# Altium footprint library 3.22-杂项.PcbLib: 985 footprints (part 63 of 64)
Each footprint in its own frame and in the unit in brackets; x right, y up, seen from the top. Pads: shape width x height; smd on the part's side, far side on the other; paste and mask are expansions set on the pad; w line width, h text height; cw(c..) or ccw(c..) is an arc to the next point about the centre after c.
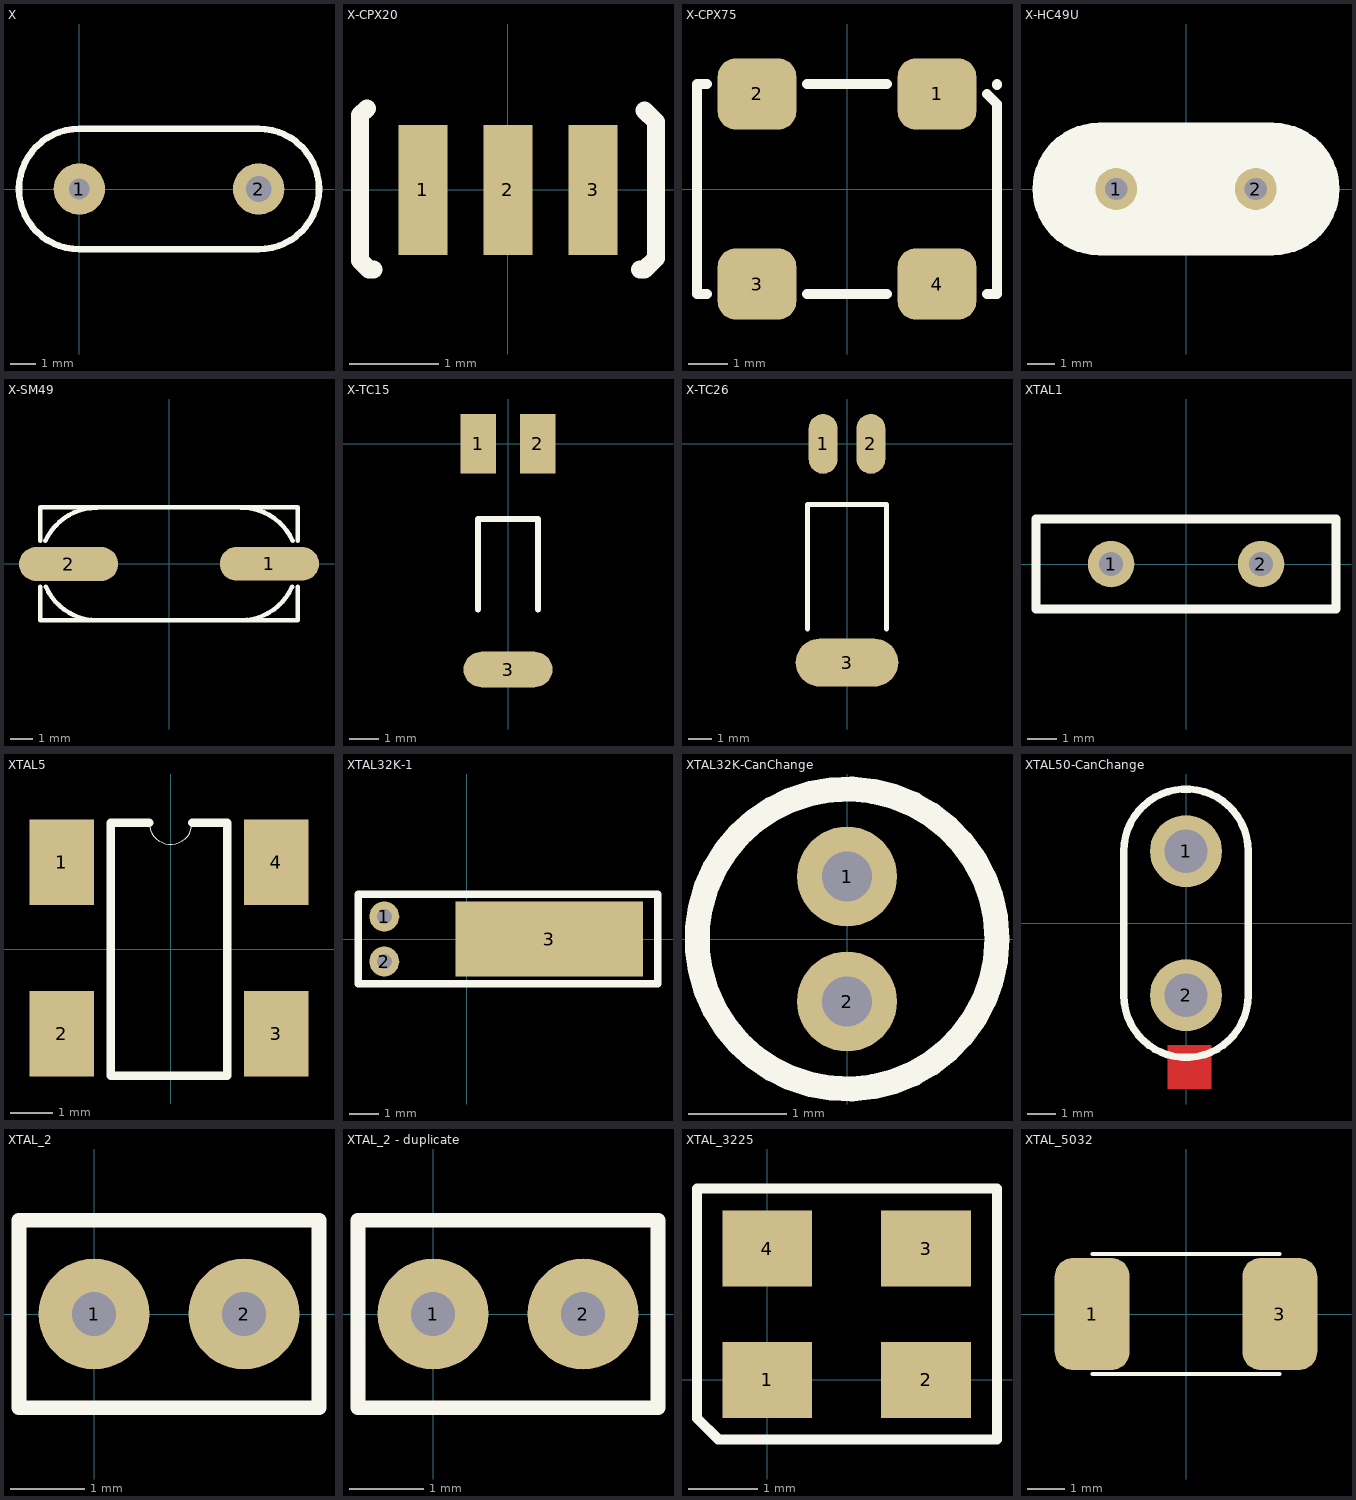
[diagram p62: the footprints below, top view; thin cyan lines are the x and y axes]

## X [mm]
pads (2):
  round 2 hole 0.8: 1(0,0)
  round 2 hole 1: 2(6.985,0)
Top Overlay:
  lines w0.254: 0,-2.35 cw(c0,0) 0,2.35 6.985,2.35 cw(c6.985,0) 6.985,-2.35 0,-2.35

## X-CPX20 [mm] "贴片晶振"
pads (3):
  rect 0.55x1.45 smd: 1(-0.95,0) 2(0,0) 3(0.95,0)
Top Overlay:
  lines w0.2: -1.576,0.911 -1.651,0.836 -1.651,-0.789 -1.551,-0.889 -1.501,-0.889 ; 1.474,-0.889 1.524,-0.889 1.651,-0.762 1.651,0.762 1.524,0.889

## X-CPX75 [mm]
height 14.8
pads (4):
  rrect50% 2x1.8 smd: 1(2.281,2.415) 2(-2.291,2.415) 3(-2.291,-2.411) 4(2.281,-2.411)
Top Overlay:
  lines w0.254: -3.561,-2.665 -3.815,-2.665 -3.815,2.669 -3.561,2.669 ; -1.021,-2.665 1.011,-2.665 ; -1.021,2.669 1.011,2.669 ; 3.551,-2.665 3.805,-2.665 3.805,2.161 3.551,2.415 ; 3.805,2.644 3.805,2.669

## X-HC49U [mil] "插件晶振"
height 157.48
pads (2):
  round 60 hole 32: 1(-100,0) 2(100,0)
Top Overlay:
  lines w10: -125,-90 cw(c-125,0) -125,90 125,90 cw(c125,0) 125,-90 -125,-90
  lines w177.17: -125,0 125,0

## X-SM49 [mm]
height 14.8
pads (2):
  oval 4.4x1.5 smd: 1(4.45,0.004) 2(-4.45,-0.004)
Top Overlay:
  lines w0.2: -5.7,-2.499 5.718,-2.499 ; -5.7,-2.496 -5.7,-1.016 ; -5.7,1.016 -5.7,2.504 5.718,2.504 5.718,1.016 ; -5.477,1.023 cw(c-3.202,-0.013) -3.175,2.487 ; -5.461,-1.016 ccw(c-3.176,-0.001) -3.176,-2.501 ; 3.175,-2.5 ccw(c3.175,0) 5.46,-1.015 ; 3.175,2.496 cw(c3.202,-0.004) 5.48,1.025 ; 5.718,-2.496 5.718,-1.016

## X-TC15 [mm] "圆柱晶振1"
pads (3):
  rect 1.2x2 smd: 1(-1,0) 2(1,0)
  oval 3x1.2 smd: 3(0,-7.62)
Top Overlay:
  lines w0.2: -1.016,-5.588 -1.016,-2.54 1.016,-2.54 1.016,-5.588
3D body: height 1.99, standoff 0, extent -0.998,-8.286 0.998,-2.286
3D body: height 1.1, standoff 0.9, extent -0.735,-3 -0.535,0
3D body: height 1.1, standoff 0.9, extent 0.535,-3 0.735,0

## X-TC26 [mm] "圆柱晶振2"
pads (3):
  oval 1.2x2.5 smd: 1(-1,0) 2(1,0)
  oval 4.3x2 smd: 3(0,-9.144)
Top Overlay:
  lines w0.2: -1.651,-7.747 -1.651,-2.54 1.651,-2.54 1.651,-7.747

## XTAL1 [mil]
pads (2):
  round 62 hole 32: 1(-100,0) 2(100,0)
Top Overlay:
  lines w12: -200,-60 -200,60 200,60 200,-60 -200,-60

## XTAL5 [mm]
pads (4):
  rect 1.5x2 smd: 1(-2.54,2.032) 2(-2.54,-1.968) 3(2.46,-1.968) 4(2.46,2.032)
Top Overlay:
  lines w0.025: -0.5,2.952 ccw(c0,2.952) 0.5,2.952
  lines w0.203: -0.5,2.952 -1.397,2.952 -1.397,-2.952 1.317,-2.952 1.317,2.952 0.5,2.952

## XTAL32K-1 [mil] "圆筒状晶振32.768K,躺着装，外壳接地"
height 314.96
pads (3):
  round 40 hole 20: 1(-110,30) 2(-110,-30)
  rect 250x100 smd: 3(110,0)
Top Overlay:
  lines w10: -145,-60 -145,60 255,60 255,-60 -145,-60

## XTAL32K-CanChange [mil] "圆筒状晶振32.768K"
height 314.96
pads (2):
  round 40 hole 20: 1(0,25) 2(0,-25)
Top Overlay:
  circle w10: c0,0 r60

## XTAL50-CanChange [mm]
pads (2):
  round 2.5 hole 1.5: 1(0,2.5) 2(0,-2.5)
Top Layer:
  rectangle: -0.635,-5.755 0.889,-4.231
Top Overlay:
  lines w0.254: -2.159,-2.5 ccw(c0,-2.5) 2.159,-2.5 2.159,2.5 ccw(c0,2.5) -2.159,2.5 -2.159,-2.5

## XTAL_2 [mm]
pads (2):
  round 1.5 hole 0.6: 1(0,0) 2(2.032,0)
Top Overlay:
  lines w0.2: -1.016,-1.27 3.048,-1.27 3.048,1.27 -1.016,1.27 -1.016,-1.27

## XTAL_2 - duplicate [mm]
pads (2):
  round 1.5 hole 0.6: 1(0,0) 2(2.032,0)
Top Overlay:
  lines w0.2: -1.016,-1.27 -1.016,1.27 3.048,1.27 3.048,-1.27 -1.016,-1.27

## XTAL_3225 [mm]
pads (4):
  rect 1.3x1.1 smd: 1(0,0) 2(2.3,0) 3(2.3,1.9) 4(0,1.9)
Top Overlay:
  lines w0.15: -1.016,-0.559 -1.016,2.769 3.327,2.769 3.327,-0.864 -0.711,-0.864 -1.016,-0.559

## XTAL_5032 [mm]
pads (2):
  rrect50% 2x3 smd: 1(-2.502,0) 3(2.502,0)
Top Overlay:
  lines w0.1: -2.502,-1.6 2.498,-1.6 ; -2.502,1.6 2.498,1.6
3D body: height 1.5, standoff 0, extent -2.502,-1.6 2.502,1.6